# Altium footprint library MyLib.PcbLib: 575 footprints (part 28 of 36)
Each footprint in its own frame and in the unit in brackets; x right, y up, seen from the top. Pads: shape width x height; smd on the part's side, far side on the other; paste and mask are expansions set on the pad; w line width, h text height; cw(c..) or ccw(c..) is an arc to the next point about the centre after c.
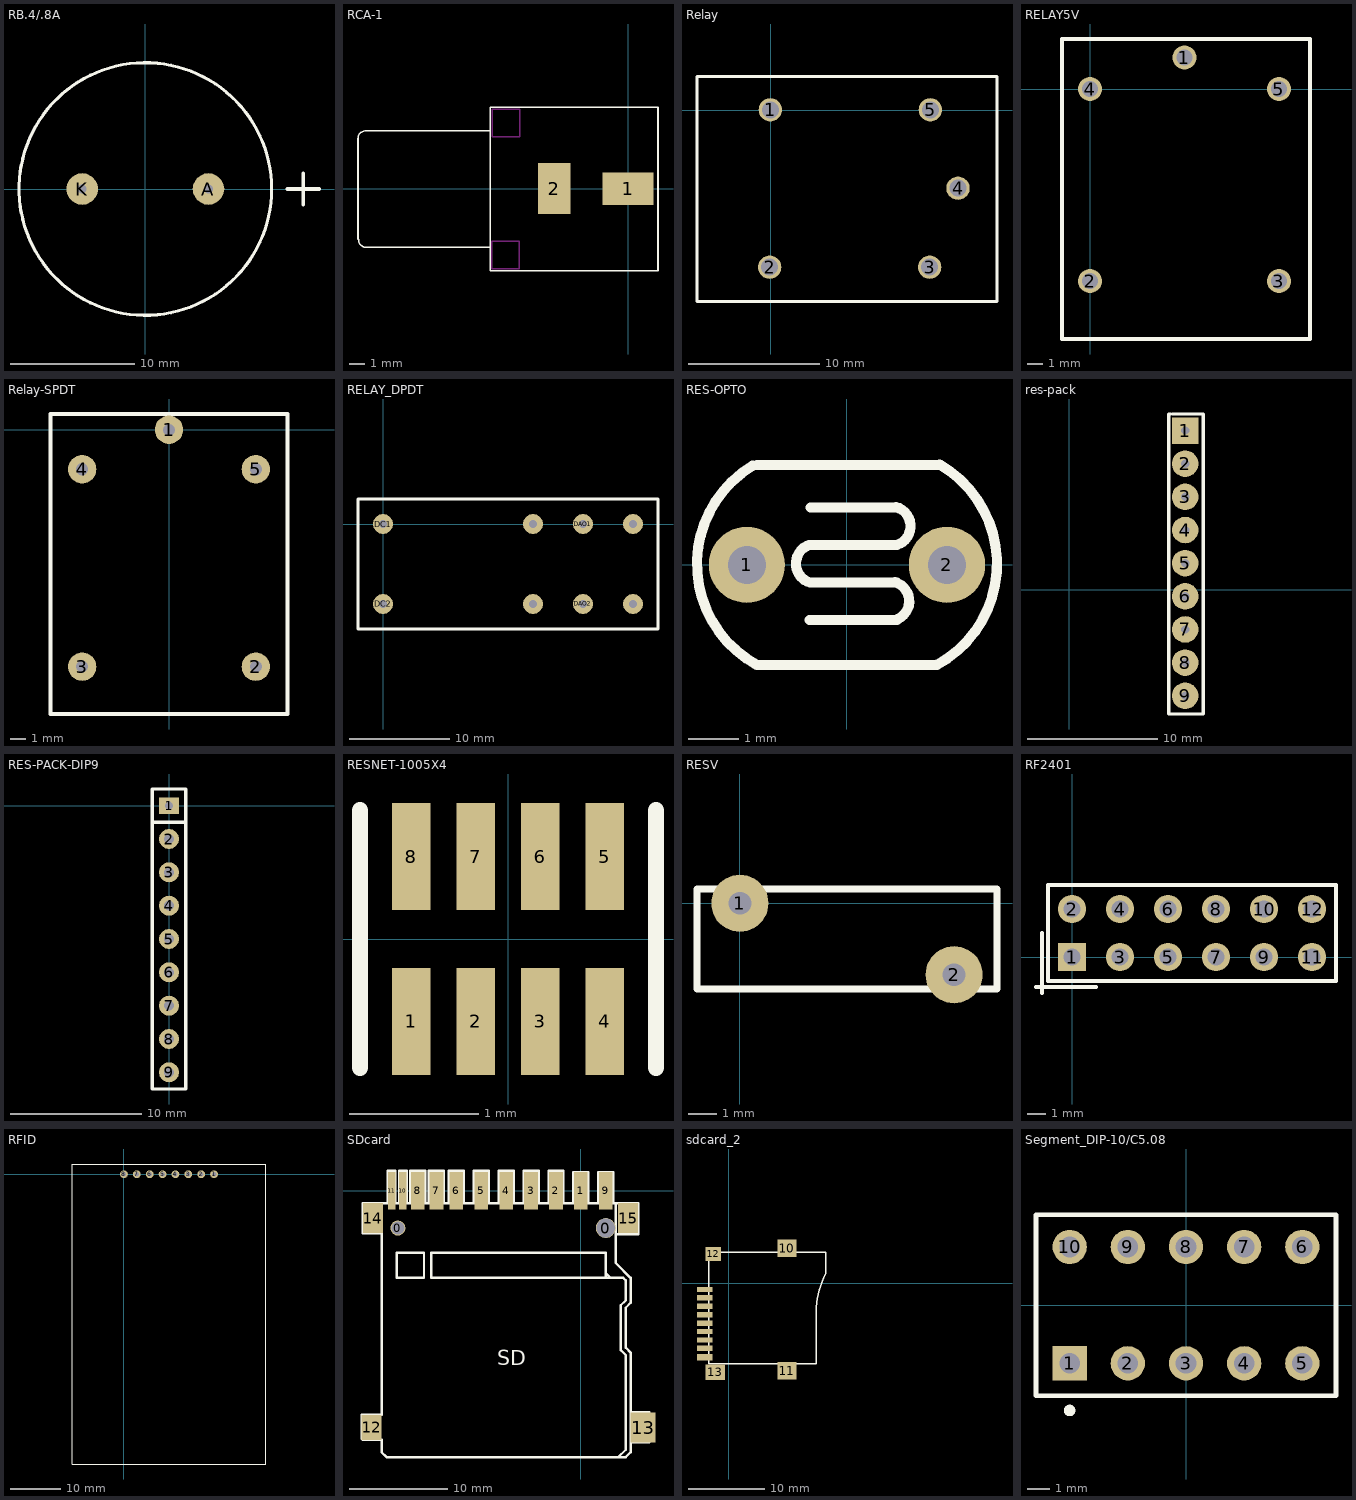
[diagram p27: the footprints below, top view; thin cyan lines are the x and y axes]

## RB.4/.8A [mil]
pads (2):
  round 100 hole 28: A(200,0) K(-200,0)
Top Overlay:
  circle w10: c0,0 r400
  lines w12: 450,0 550,0 ; 500,-50 500,50

## RCA-1 [mm]
pads (2):
  rect 3.3x2.1 all layers, no hole: 1(0,0)
  rect 2.1x3.3 all layers, no hole: 2(-4.75,0)
Top Overlay:
  lines w0.1: -17.383,-3.242 -17.383,3.225 cw(c-16.883,3.225) -16.875,3.725 -8.875,3.725 ; -17.35,-3.275 ccw(c-16.85,-3.283) -16.85,-3.783 ; -16.875,-3.775 -8.875,-3.775 ; -8.875,-5.275 -8.875,5.225 1.925,5.225 1.925,-5.275 -8.875,-5.275
Keep-Out Layer:
  lines w0.1: -8.775,-5.125 -8.75,-5.15 -7,-5.15 -7,-3.375 -8.775,-3.375 -8.775,-5.125 ; -8.75,3.325 -8.75,5.1 -6.975,5.1 -6.975,3.325 -8.75,3.325
Mechanical 1:
  lines w0.1: -5.375,-1.225 -4.175,-1.225 -4.175,1.175 -5.375,1.175 -5.375,-1.225 ; -1.175,-0.625 -1.175,0.575 1.225,0.575 1.225,-0.625 -1.175,-0.625
3D body "CUI-DEFAULT.STEP": height 11.86, standoff -3.64, extent -17.628,-5 1.872,5

## Relay [mil]
pads (5):
  round 70 hole 51.18: 1(-0.5,1) 2(-2.5,-471) 3(477.5,-471) 4(562.5,-234) 5(479.5,1)
Top Overlay:
  lines w10: -220.5,-574 679.5,-574 679.5,101 -220.5,101 -220.5,-574
3D body "Relay_OMRON G5LC-14.STEP": height 602.36, standoff -196.85, extent -141.96,-545.24 610.01,65

## RELAY5V [mil]
pads (5):
  round 60 hole 40: 1(236.22,78.74) 2(0,-480.31) 3(472.44,-480.31) 4(0,0) 5(472.44,0)
Top Overlay:
  lines w10: -70,-625 550,-625 550,125 -70,125 -70,-625
3D body "Relay_OMRON G5LC-14.STEP": height 602.36, standoff -196.85, extent -65,-621.97 545.24,130

## Relay-SPDT [mm]
height 15.5
pads (5):
  round 1.8 hole 0.762: 1(0,0) 2(5.5,-15) 3(-5.5,-15) 4(-5.5,-2.5) 5(5.5,-2.5)
Top Overlay:
  lines w0.254: -7.5,-18 -7.5,1 7.5,1 7.5,-18 -7.5,-18
3D body: height 16, standoff 0.5, extent -7.627,-18.127 7.627,1.127
3D body: height 4, standoff -2, extent -0.396,-0.396 0.396,0.396
3D body: height 4, standoff -2, extent 5.104,-2.896 5.896,-2.104
3D body: height 4, standoff -2, extent -5.896,-2.896 -5.104,-2.104
3D body: height 4, standoff -2, extent 5.104,-15.396 5.896,-14.604
3D body: height 4, standoff -2, extent -5.896,-15.396 -5.104,-14.604

## RELAY_DPDT [mm]
pads (8):
  round 2 hole 0.8: DAO1(20,0) DAO1L(15,0) DAO1R(25,0) DAO2(20,-8) DAO2L(15,-8) DAO2R(25,-8) DC1(0,0) DC2(0,-8)
Top Overlay:
  lines w0.254: -2.5,-10.5 -2.5,2.5 27.5,2.5 27.5,-10.5 26.5,-10.5 -2.5,-10.5
3D body: height 4, standoff -2, extent -0.422,-0.422 0.371,0.371
3D body: height 4, standoff -2, extent -0.422,-8.422 0.371,-7.629
3D body: height 4, standoff -2, extent 14.578,-8.422 15.371,-7.629
3D body: height 4, standoff -2, extent 24.578,-8.422 25.371,-7.629
3D body: height 4, standoff -2, extent 24.578,-0.422 25.371,0.371
3D body: height 4, standoff -2, extent 19.578,-0.422 20.371,0.371
3D body: height 4, standoff -2, extent 14.578,-0.422 15.371,0.371
3D body: height 4, standoff -2, extent 19.578,-8.422 20.371,-7.629
3D body: height 15, standoff 0.5, extent -2.627,-10.627 27.627,2.627

## RES-OPTO [mil]
height 118.11
pads (2):
  round 60 hole 30: 1(-78.74,0) 2(78.74,0)
Top Overlay:
  lines w7.99: -74.37,78.02 ccw(c-27.64,0.65) -70.87,-78.74 ; -29.53,15.75 ccw(c-24.61,0.98) -28.88,-13.98 ; 37.74,-13.58 cw(c33.46,-28.54) 38.39,-43.31 ; 38.72,45.48 cw(c34.45,30.51) 39.37,15.75 ; 70.95,-78.63 ccw(c27.72,0.76) 72.98,79
  lines w8: -70.87,78.74 70.87,78.74 ; -68.9,-78.74 68.9,-78.74 ; -29.53,-43.31 39.37,-43.31 ; -28.54,-13.78 39.37,-13.78 ; -28.54,15.75 39.37,15.75 ; -28.54,45.28 38.39,45.28
3D body "OptoRes.STEP": height 114.17, standoff -66.93, extent -114.93,-80 114.95,80

## res-pack [mil]
height 50
pads (9):
  rect 80x80 hole 25: 1(350,480)
  round 80 hole 25: 2(350,380) 3(350,280) 4(350,180) 5(350,80) 6(350,-20) 7(350,-120) 8(350,-220) 9(350,-320)
Top Overlay:
  lines w10: 300,520 300,-375 405,-375 405,-365 405,530 310,530 ; 300,525 300,530 305,530
3D body "Res Pack 8.STEP": height 201.89, standoff -130, extent 300.79,-368.82 399.21,529.21

## RES-PACK-DIP9 [mil]
pads (9):
  rect 59.06x50 hole 25: 1(0,0)
  round 60 hole 30: 2(0,-100) 3(0,-200) 4(0,-300) 5(0,-400) 6(0,-500) 7(0,-600) 8(0,-700) 9(0,-800)
Top Overlay:
  lines w10: -50,-50 50,-50 ; -50,-850 50,-850 50,50 -50,50 -50,-850
3D body "RESPACK-DIP9.STEP": height 459.24, standoff -78.74, extent -61.02,-832.41 59.06,31

## RESNET-1005X4 [mm]
pads (8):
  rect 0.3x0.83 smd: 1(-0.75,-0.64) 2(-0.25,-0.64) 3(0.25,-0.64) 4(0.75,-0.64) 5(0.75,0.64) 6(0.25,0.64) 7(-0.25,0.64) 8(-0.75,0.64)
Top Overlay:
  lines w0.127: -1.15,-1 -1.15,1 ; 1.15,-1 1.15,1
3D body: height 0.5, standoff 0, extent -1.043,-0.736 1.043,0.737

## RESV [mm]
height 5
pads (2):
  round 2 hole 0.8: 1(0,0) 2(7.5,-2.5)
Top Overlay:
  lines w0.254: -1.5,-3 -1.5,0.5 9,0.5 9,-3 -1.5,-3
3D body: height 11, standoff -2, extent -1.19,-3.12 8.81,0.58

## RF2401 [mm]
pads (12):
  rect 1.5x1.5 hole 0.9: 1(0,0)
  round 1.5 hole 0.9: 2(0,2.54) 3(2.54,0) 4(2.54,2.54) 5(5.08,0) 6(5.08,2.54) 7(7.62,0) 8(7.62,2.54) 9(10.16,0) 10(10.16,2.54) 11(12.7,0) 12(12.7,2.54)
Top Overlay:
  lines w0.2: -1.27,-1.27 13.97,-1.27 13.97,3.81 -1.27,3.81 -1.27,-1.27
  lines w0.203: -1.905,-1.587 1.27,-1.587 ; -1.587,-1.905 -1.587,1.27
3D body "RF2401.STEP": height 57.51, standoff -4.96, extent -2.15,-1.27 14.85,32.73

## RFID [mil]
pads (8):
  round 60 hole 35: 1(700,0) 2(600,0) 3(500,0) 4(400,0) 5(300,0) 6(200,0) 7(100,0) 8(0,0)
Top Overlay:
  lines w5: -400,-2250 1100,-2250 1100,-1200 1100,80 -400,80 -400,-2250

## SDcard [mil] "WWW.OURAVR.COM"
pads (17):
  round 60 hole 52: 0(-735,-150)
  round 80 hole 75: 0(100,-150)
  rect 55x150 smd: 1(0,0) 2(-100,0) 3(-200,0) 4(-300,0) 5(-400,0) 6(-500,0) 7(-580,0) 8(-655,0) 9(100,0)
  rect 30x150 smd: 10(-715,0) 11(-760,0)
  rect 80x100 smd: 12(-840,-950)
  rect 100x120 smd: 13(249.63,-950.84)
  rect 80x120 smd: 14(-835,-110) 15(190,-110)
Top Overlay:
  lines w10: -775,-50 -775,80 -745,80 -745,-50 -800,-50 -875,-50 -875,-170 -800,-170 -800,-900 -880,-900 -880,-995 -875,-1000 -800,-1000 -800,-1050 -780,-1070 -770,-1070 180,-1070 200,-1050 200,-650 180,-630 180,-470 200,-450 200,-440 200,-370 200,-350 140,-290 140,-60 140,-50 ; -750,-50 140,-50 ; -730,-50 -730,80 -700,80 -700,-50 ; -685,-45 -685,80 -625,80 -625,-45 ; -650,-350 -630,-350 -630,-250 -740,-250 -740,-350 -640,-350 ; -610,-45 -610,80 -550,80 -550,-45 ; -530,-45 -530,80 -470,80 -470,-45 ; -430,-45 -430,80 -370,80 -370,-45 ; -330,-45 -330,80 -270,80 -270,-45 ; -230,-45 -230,80 -170,80 -170,-45 ; -130,-45 -130,80 -70,80 -70,-45 ; -30,-50 -30,75 30,75 30,-50 ; 70,-50 70,75 130,75 130,-50 ; 100,-330 120,-350 ; 140,-175 230,-175 230,-50 140,-50 ; 150,-1070 180,-1040 180,-670 180,-660 160,-640 160,-460 180,-440 180,-360 170,-350 100,-350 ; 200,-1010 275,-1010 ; 200,-890 275,-890 ; 100,-350 100,-340 100,-250 -600,-250 -600,-350 100,-350
  text "SD" at -335,-700 h60

## sdcard_2 [mil]
pads (13):
  rect 80x27.56 smd: 1(-122.67,-32.8) 2(-122.67,-76.11) 3(-122.67,-119.42) 4(-122.67,-162.72) 5(-122.67,-206.03) 6(-122.67,-249.34) 7(-122.67,-292.64) 8(-122.67,-335.95)
  rect 80x33.46 smd: 9(-122,-382)
  rect 98.43x90 smd: 10(300,180) 11(300,-450)
  rect 80x70 smd: 12(-80,150)
  rect 100x80 smd: 13(-68,-459)
Top Overlay:
  lines w7.87: 450,-159.01 450,-415 -101.98,-415 -101.98,160 500,160 500,50 ; 450.55,-169.35 cw(c915.95,-159.01) 499.58,49.17

## Segment_DIP-10/C5.08 [mm]
pads (10):
  rect 1.5x1.5 hole 0.9: 1(-5.08,-2.54)
  round 1.5 hole 0.9: 2(-2.54,-2.54) 3(0,-2.54) 4(2.54,-2.54) 5(5.08,-2.54) 6(5.08,2.54) 7(2.54,2.54) 8(0,2.54) 9(-2.54,2.54) 10(-5.08,2.54)
Top Overlay:
  circle w0.25: c-5.08,-4.6 r0.125
  lines w0.2: -6.55,-3.95 6.55,-3.95 6.55,3.95 -6.55,3.95 -6.55,-3.95